# Altium footprint library 开关_按键封装库.PcbLib: 175 footprints (part 11 of 11)
Each footprint in its own frame and in the unit in brackets; x right, y up, seen from the top. Pads: shape width x height; smd on the part's side, far side on the other; paste and mask are expansions set on the pad; w line width, h text height; cw(c..) or ccw(c..) is an arc to the next point about the centre after c.
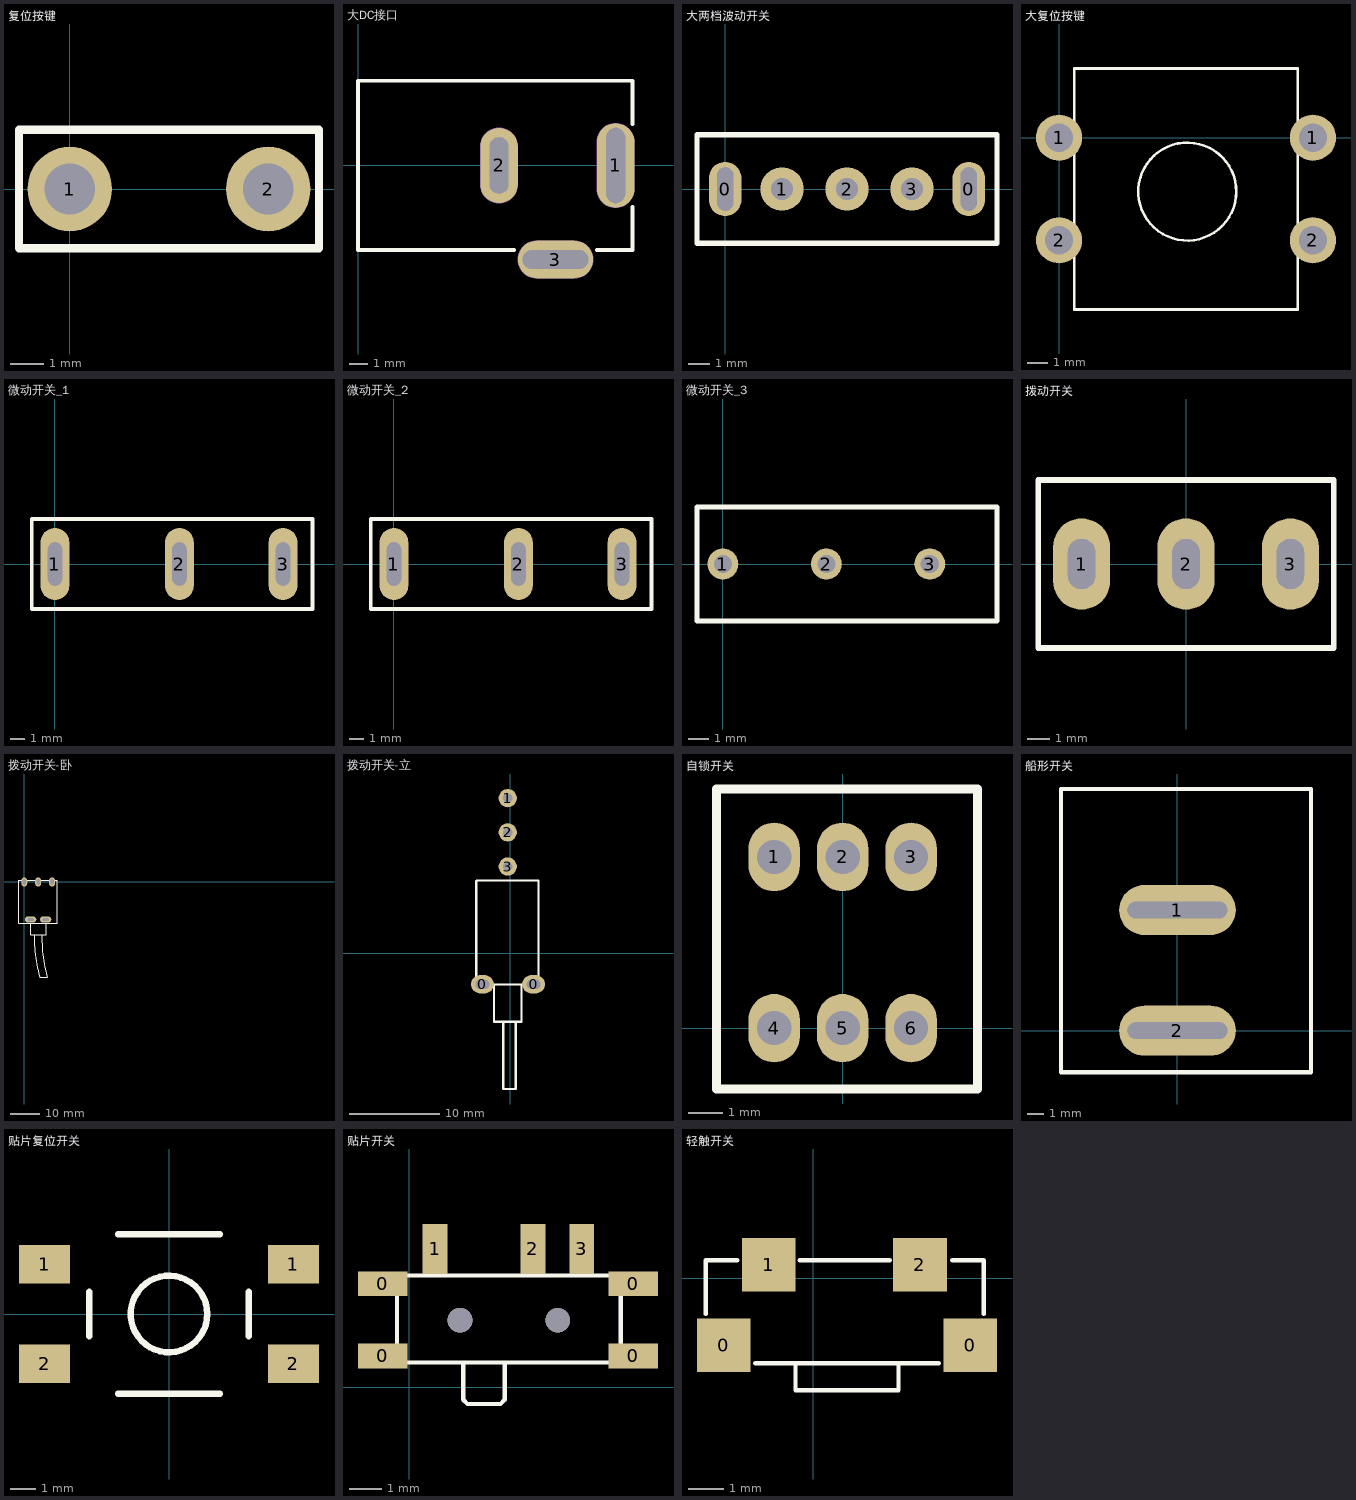
[diagram p10: the footprints below, top view; thin cyan lines are the x and y axes]

## 复位按键 [mil]
pads (2):
  round 100 hole 60: 1(0,0) 2(235,0)
Top Overlay:
  lines w10: -60,-70 -60,70 295,70 295,-70 -60,-70
3D body "43408.stp": height 169.29, standoff -137.7, extent -33.91,-68.89 273.92,68.9

## 大DC接口 [mm] "DC Power Jack, 2.5mm, KLD Series, PCB Mount"
pads (3):
  oval 2x4.5 hole 1 slot 4 at 90 deg: 1(13.7,0)
  oval 2x4 hole 1 slot 3 at 90 deg: 2(7.5,0)
  oval 4x2 hole 1 slot 3.5 at 0 deg: 3(10.5,-5)
Top Overlay:
  lines w0.2: 8.3,-4.5 0,-4.5 0,4.5 14.6,4.5 14.6,2.2 ; 12.7,-4.5 14.6,-4.5 14.6,-2.2
Mechanical 1:
  lines w1: 7.5,-1 7.5,1 ; 9.5,-5 11.5,-5 ; 13.7,-1.25 13.7,1.25
Mechanical 2:
  lines w2.016: 7.5,-1 7.5,1 ; 9.5,-5 11.5,-5 ; 13.7,-1.25 13.7,1.25

## 大两档波动开关 [mil]
pads (5):
  oval 60x100 hole 30 slot 80 at 90 deg: 0(0,0) 0(450,0)
  round 80 hole 40: 1(105,0) 2(225,0) 3(345,0)
Top Overlay:
  lines w10: -52,-100 -52,100 502,100 502,-100 -52,-100
3D body "User Library-SLB12804.STEP": height 379.92, standoff -102.36, extent -50.58,-122.05 500.6,122.05

## 大复位按键 [mil]
pads (4):
  round 90 hole 55: 1(0,0) 1(495,0) 2(0,-200) 2(495,-200)
Top Overlay:
  circle w5: c250,-105 r95.52
  lines w5: 30,-335 30,135 465,135 465,-335 30,-335
3D body "User Library-tact switch 12x12x8mm.step": height 334.65, standoff -137.8, extent -28.02,-336.22 518.03,136.22

## 微动开关_1 [mil]
pads (3):
  oval 80x200 hole 40 slot 120 at 90 deg: 1(0,0) 2(346,0) 3(634,0)
Top Overlay:
  lines w10: -64,-125 -64,125 716,125 716,-125 -64,-125
3D body "33862.stp": height 464.1, standoff -303.15, extent -63.76,-125.97 715.77,125.99

## 微动开关_2 [mil]
pads (3):
  oval 80x200 hole 40 slot 120 at 90 deg: 1(0,0) 2(346,0) 3(634,0)
Top Overlay:
  lines w10: -64,-125 -64,125 716,125 716,-125 -64,-125
3D body "33869.stp": height 649.61, standoff -303.15, extent -63.76,-125.98 715.77,125.99

## 微动开关_3 [mil]
pads (3):
  round 60 hole 35: 1(0,0) 2(200,0) 3(400,0)
Top Overlay:
  lines w10: -50,-110 530,-110 530,110 -50,110 -50,-110
3D body "User Library-MICRO SWITCH_SMALL.STEP": height 485, standoff -95, extent -50.48,-110 530.48,110

## 拨动开关 [mm]
pads (3):
  oval 2.5x4 hole 1.2 slot 2.2 at 90 deg: 1(-4.572,0) 2(0,0) 3(4.572,0)
Top Overlay:
  lines w0.254: -6.477,-3.683 -6.477,3.683 6.477,3.683 6.477,-3.683 -6.477,-3.683
3D body "User Library-7101SYZQE_switch-toggle.STEP": height 28.95, standoff -3.43, extent -6.35,-5.08 6.364,5.08

## 拨动开关-卧 [mil]
pads (5):
  oval 150x80 hole 30 slot 80 at 0 deg: 0(85,-500) 0(285,-500)
  oval 80x120 hole 40 slot 70 at 90 deg: 1(0,0) 2(185,0) 3(370,0)
Top Overlay:
  lines w10: 85,-550 85,-700 290,-700 290,-550 ; 135.33,-706.02 ccw(c1977.86,-761.46) 205.38,-1267.75 304.64,-1267.75 ; 235.33,-701.02 ccw(c2077.86,-756.46) 306.33,-1266.05 ; -70,-550 -70,25 440,25 440,-550 -70,-550
3D body "SW3dPS-Switch toggle NKK M2012SA2W30.STEP": height 307.31, standoff -174.5, extent -71,-1267.98 441,23.71

## 拨动开关-立 [mil]
pads (5):
  oval 100x80 hole 40 slot 60 at 0 deg: 0(-121,-136) 0(103,-136)
  round 80 hole 40: 1(-10,680) 2(-10,530) 3(-10,380)
Top Overlay:
  lines w10: -148,-140 -148,316 -145,319 125,319 125,-136 126,-137 -145,-137 ; -70,-137 -70,-300 50,-300 50,-137 ; -30,-305 -30,-595 25,-595 25,-300
3D body "User Library-PushButton SPDT-M7 (E-Switch).STEP": height 503.94, standoff -182.65, extent -146.65,-600.47 125,690.47

## 自锁开关 [mm]
pads (6):
  oval 1.5x2 hole 1: 1(-2,5) 2(0,5) 3(2,5) 4(-2,0) 5(0,0) 6(2,0)
Top Overlay:
  lines w0.254: -3.683,-1.778 -3.683,6.985 -3.175,6.985 3.937,6.985 3.937,-1.778 -3.683,-1.778

## 船形开关 [mm]
pads (2):
  oval 7x3 hole 1 slot 6 at 0 deg: 1(0,7.239) 2(0,0)
Top Overlay:
  lines w0.254: -6.985,-2.5 -6.985,14.5 8.015,14.5 8.015,-2.5 -6.985,-2.5

## 贴片复位开关 [mil]
pads (4):
  rect 80x60 smd: 1(-195,78) 1(195,78) 2(-195,-78) 2(195,-78)
Top Overlay:
  circle w10: c0,0 r60
  lines w9.84: -125,-35 -125,35 ; -80,-125 80,-125 ; -80,125 80,125 ; 125,-35 125,35
3D body "User Library-PUSH BUTTON-3.STEP": height 174.8, standoff -3.94, extent -196.85,-118.11 196.86,118.11

## 贴片开关 [mil]
pads (7):
  rect 60x30 smd: 0(-32,38) 0(-32,125) 0(270,38) 0(270,125)
  rect 30x60 smd: 1(31,167) 2(149,167) 3(208,167)
via 179,81 diameter 30 hole 30
via 61,81 diameter 30 hole 30
Top Overlay:
  lines w5: 65,30 65,-15 70,-20 110,-20 115,-15 115,30 ; -15,30 -15,135 255,135 255,30 -15,30
3D body "贴片开关-1565.step": height 55.12, standoff -19.68, extent -31.57,-21.17 271.58,167.8

## 轻触开关 [mil]
pads (4):
  rect 60x60 smd: 0(-100,-75) 0(175,-75) 1(-50,15) 2(119,15)
Top Overlay:
  lines w5: -120,-40 -120,20 -85,20 ; -65,-95 140,-95 ; -20,-95 -20,-125 95,-125 95,-95 ; -15,20 85,20 ; 155,20 190,20 190,-40
3D body "Switch - TL3330AF130QG (Tact Switch, SMD).step": height 137.8, standoff 0, extent -118.54,-125.04 188.55,16.69